# Altium footprint library OSHW_LuxonisMaster_20201223.PcbLib: 112 footprints (part 3 of 7)
Each footprint in its own frame and in the unit in brackets; x right, y up, seen from the top. Pads: shape width x height; smd on the part's side, far side on the other; paste and mask are expansions set on the pad; w line width, h text height; cw(c..) or ccw(c..) is an arc to the next point about the centre after c.
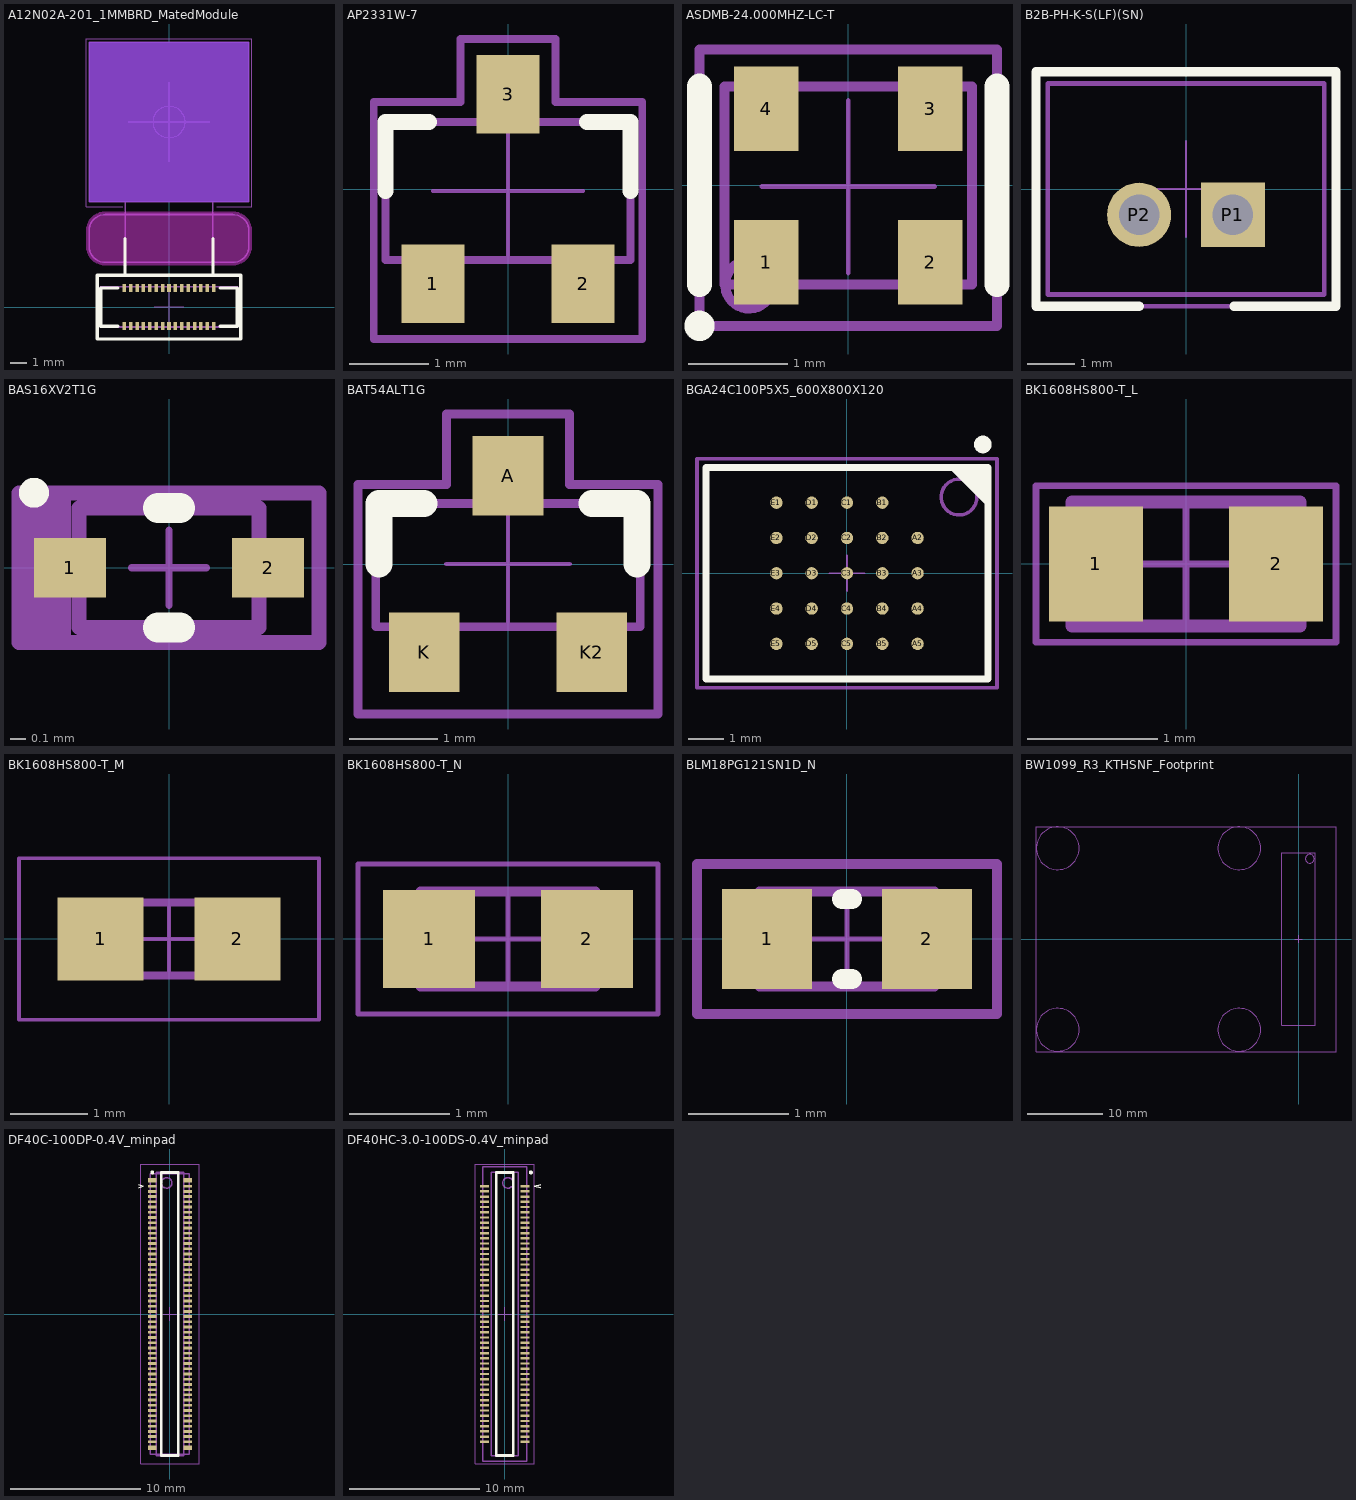
[diagram p2: the footprints below, top view; thin cyan lines are the x and y axes]

## A12N02A-201_1MMBRD_MatedModule [mm] "connector: 24-5804-030-000-829+ (1.4mm height w/ module mated)"
height 1.4
pads (30):
  rect 0.22x0.5 smd mask+0.05: 1(-2.8,-1.2) 2(-2.4,-1.2) 3(-2,-1.2) 4(-1.6,-1.2) 5(-1.2,-1.2) 6(-0.8,-1.2) 7(-0.4,-1.2) 8(0,-1.2) 9(0.4,-1.2) 10(0.8,-1.2) 11(1.2,-1.2) 12(1.6,-1.2) 13(2,-1.2) 14(2.4,-1.2) 15(2.8,-1.2) 16(2.8,1.2) 17(2.4,1.2) 18(2,1.2) 19(1.6,1.2) 20(1.2,1.2) 21(0.8,1.2) 22(0.4,1.2) 23(0,1.2) 24(-0.4,1.2) 25(-0.8,1.2) 26(-1.2,1.2) 27(-1.6,1.2) 28(-2,1.2) 29(-2.4,1.2) 30(-2.8,1.2)
Bottom Layer keep-out:
  region: -4.999,16.599 4.999,16.599 4.999,6.601 -4.999,6.601
Top Overlay:
  lines w0.2: -3.2,-1.2 -4.275,-1.2 -4.275,1.2 -3.2,1.2 ; -2.75,2 -2.75,4.3 ; 2.75,2 2.75,4.3 ; 3.2,-1.2 4.275,-1.2 4.275,1.2 3.2,1.2 ; -4.5,-2 4.5,-2 4.5,2 -4.5,2 -4.5,-2
Bottom Overlay:
  lines w0.2: -2.75,4.3 -2.75,6.6 ; 2.75,4.3 2.75,6.6 ; -5,6.6 5,6.6 5,16.6 -5,16.6 -5,6.6
Keep-Out Layer:
  board cut-out: -5,4.8 -5,4.898 -4.962,5.092 -4.886,5.274 -4.777,5.437 -4.637,5.577 -4.474,5.686 -4.292,5.762 -4.098,5.8 -4,5.8 4,5.8 4.098,5.8 4.292,5.762 4.474,5.686 4.637,5.577 4.777,5.437 4.886,5.274 4.962,5.092 5,4.898 5,4.8 5,3.8 5,3.702 4.962,3.508 4.886,3.326 4.777,3.163 4.637,3.023 4.474,2.914 4.292,2.838 4.098,2.8 4,2.8 -4,2.8 -4.098,2.8 -4.292,2.838 -4.474,2.914 -4.637,3.023 -4.777,3.163 -4.886,3.326 -4.962,3.508 -5,3.702 -5,3.8
Keep-Out Layer:
  lines w0.2: -5.1,3.8 ccw(c-4,3.8) -4,2.7 0,2.7 4,2.7 ccw(c4,3.8) 5.1,3.8 5.1,4.8 ccw(c4,4.8) 4,5.9 -4,5.9 ccw(c-4,4.8) -5.1,4.8 -5.1,3.8
Board:
  lines w0.1: -5,3.8 ccw(c-4,3.8) -4,2.8 4,2.8 ccw(c4,3.8) 5,3.8 5,4.8 ccw(c4,4.8) 4,5.8 -4,5.8 ccw(c-4,4.8) -5,4.8 -5,3.8
Top Assembly:
  lines w0.1: -2.75,4.3 -2.75,2 ; 2.75,4.3 2.75,2 ; -2.75,2 2.75,2 ; -2.75,2 -4.5,2 -4.5,-2 4.5,-2 4.5,2 2.75,2
  text "'.Designator'" at 0,0.006 h1
Bottom Assembly:
  circle w0.1: c0,11.6 r1
  lines w0.1: -2.75,4.3 -2.75,6.6 ; -2.51,11.6 2.51,11.6 ; 0,9.1 0,14.1 ; 2.75,4.3 2.75,6.6 ; 2.51,11.6 2.51,11.6 ; 4.999,16.6 4.999,6.601 -4.999,6.601 -4.999,16.599 5,16.599 5,16.6 ; 4.999,16.6 5,16.6
Top Courtyard:
  lines w0.05: -2.75,4.3 -2.75,2 ; -0.91,0.006 0,0.006 ; 0,-0.904 0,0.006 ; 0,0.916 0,0.006 ; 0.91,0.006 0,0.006 ; 2.75,4.3 2.75,2 ; -2.75,2 -4.5,2 -4.5,-2 4.5,-2 4.5,2 2.75,2 ; -2.75,2 2.75,2
Bottom Courtyard:
  lines w0.05: -2.91,6.3 -5.2,6.3 -5.2,16.8 5.2,16.8 5.2,15.6 5.2,6.3 3,6.3
Top Component Outline:
  lines w0.1: -4.3,-1.25 4.3,-1.25 4.3,1.262 -4.3,1.262 -4.3,-1.25
Bottom Component Outline:
  lines w0.1: -4.999,6.601 4.999,6.601 4.999,16.599 -4.999,16.599 -4.999,6.601
3D body: height 1.27, standoff 1.1, extent -2.75,2 2.75,4.3
3D body: height 1.4, standoff 1, extent -4.5,-2 4.5,2
3D body "K3D-WP7A-S030VA1-V2_JAE_Proprietary.STEP": height 0.65, standoff -0.03, extent -4.3,-1.25 4.3,1.262
3D body: height 0.55, standoff 0.35, extent -2.75,4.3 2.75,6.6
3D body: height 6.18, standoff 0.25, extent -4.999,6.601 4.999,16.599
3D body: height 3.29, standoff -3.29, extent -4.445,-2.032 -4.445,-2.032
3D body: height 3.29, standoff -3.29, extent -4.699,-4.191 -4.699,-4.191
3D body: height 3.29, standoff -3.29, extent -4.191,-5.715 -4.191,-5.715
3D body: height 3.29, standoff -3.29, extent -4.572,2.032 -4.572,2.032

## AP2331W-7 [mm]
pads (3):
  rect 0.8x1 smd: 1(-0.95,-1.2) 2(0.95,-1.2) 3(0,1.2)
Top Overlay:
  lines w0.2: -1.55,-0.025 -1.55,0.85 -1,0.85 ; 1,0.85 1.55,0.85 1.55,-0.025
Top Assembly:
  lines w0.1: -1.7,-1.9 -1.7,1.1 -0.6,1.1 -0.6,1.9 0.6,1.9 0.6,1.1 1.7,1.1 1.7,-1.9 -1.7,-1.9
  text "'.Designator'" at 0,-0.025 h1
Top Courtyard:
  lines w0.05: 0,-0.9 0,-0.025 ; 0,0.85 0,-0.025 ; 0.95,-0.025 0,-0.025 ; -0.95,-0.025 -0.95,-0.025 ; -0.95,-0.025 0,-0.025 ; 0,-0.025 0,-0.025 ; -1.7,-1.9 -1.7,1.1 -0.6,1.1 -0.6,1.9 0.6,1.9 0.6,1.1 1.7,1.1 1.7,-1.9 -1.7,-1.9
Top Component Outline:
  lines w0.1: -1.55,-0.9 -1.55,0.85 1.55,0.85 1.55,-0.9 -1.55,-0.9
3D body: height 1.4, standoff 0.1, extent -1.552,-0.9 1.552,0.85

## ASDMB-24.000MHZ-LC-T [mm]
pads (4):
  rect 0.65x0.85 smd: 1(-0.825,-0.775) 2(0.825,-0.775) 3(0.825,0.775) 4(-0.825,0.775)
Top Overlay:
  circle w0.254: c-1.5,-1.416 r0.025
  lines w0.254: -1.5,-1 -1.5,1 ; 1.5,-0.999 1.5,1
Top Assembly:
  circle w0.1: c-1,-1 r0.242
  lines w0.1: -1.5,-1.416 -1.5,1.37 1.5,1.37 1.5,-1.416 -1.5,-1.416
  text "'.Designator'" at 0,-0.011 h1
Top Courtyard:
  lines w0.05: -0.87,-0.011 0,-0.011 ; 0,-0.881 0,-0.011 ; 0,0.859 0,-0.011 ; 0.87,-0.011 0,-0.011 ; -1.5,-1.416 -1.5,1.37 1.5,1.37 1.5,-1.416 -1.5,-1.416
Top Component Outline:
  lines w0.1: -1.25,-1 1.25,-1 1.25,1 -1.25,1 -1.25,-1
3D body "ASDMB.STEP": height 0.86, standoff 0.01, extent -1.25,-1 1.25,1

## B2B-PH-K-S(LF)(SN) [mm] "3.4mm pins, 6mm housing"
height 6
pads (2):
  rect 1.368x1.368 hole 0.86: P1(1,-0.55)
  round 1.368 hole 0.86: P2(-1,-0.55)
Top Overlay:
  lines w0.2: -1,-2.5 -3.2,-2.5 -3.2,2.5 3.2,2.5 3.2,-2.5 1.024,-2.5
Top Assembly:
  lines w0.1: -3.2,-2.5 3.2,-2.5 3.2,2.5 -3.2,2.5 -3.2,-2.5
  text "'.Designator'" at 0,0 h1
Top Courtyard:
  lines w0.05: -1.024,0 0,0 ; 0,-1.024 0,0 ; 0,1.024 0,0 ; 1.024,0 0,0 ; -3.2,-2.5 -3.2,2.5 3.2,2.5 3.2,-2.5 -3.2,-2.5
Top Component Outline:
  lines w0.1: 2.95,-2.25 2.95,2.25 -2.95,2.25 -2.95,-2.25 2.95,-2.25 ; 2.95,-2.25 2.95,-2.25
3D body "B2B-PH-K-S(LF)(SN)--3DModel-STEP-56544.STEP": height 6, standoff -3.4, extent -2.95,-2.25 2.95,2.25

## BAS16XV2T1G [mm] "SOD, 2-Leads, Body 1.2x0.8mm"
height 0.7
pads (2):
  rect 0.48x0.4 smd: 1(-0.66,0) 2(0.66,0)
Top Overlay:
  circle w0.1: c-0.9,0.5 r0.05
  lines w0.2: -0.074,-0.4 0.074,-0.4 ; -0.074,0.4 0.074,0.4
Top Assembly:
  rectangle: -1,-0.5 -0.703,0.5
  lines w0.1: -0.703,-0.5 -0.703,0.5 ; -1,-0.5 1,-0.5 1,0.5 -1,0.5 -1,-0.5
  text "'.Designator'" at 0,0 h1
Top Courtyard:
  lines w0.05: -0.25,0 0.25,0 ; 0,-0.25 0,0.25 ; -1,-0.5 -1,0.5 1,0.5 1,-0.5 -1,-0.5
Top Component Outline:
  lines w0.1: -0.6,-0.4 -0.6,0.4 0.6,0.4 0.6,-0.4 -0.6,-0.4
3D body: height 0.7, standoff 0, extent -0.6,-0.4 0.6,0.4

## BAT54ALT1G [mm] "SOT-23 (TO-236)"
height 1.11
pads (3):
  rect 0.8x0.9 smd: A(0,1) K(-0.95,-1) K2(0.95,-1)
Top Overlay:
  lines w0.305: -1.46,0 -1.46,0.686 -0.952,0.686 ; 0.953,0.686 1.461,0.686 1.461,0
Top Assembly:
  lines w0.1: -1.7,-1.7 1.7,-1.7 1.7,0.9 0.698,0.9 0.698,1.7 -0.698,1.7 -0.698,0.9 -1.7,0.9 -1.7,-1.7
  text "'.Designator'" at 0,0 h1
Top Courtyard:
  lines w0.05: -0.698,0 0.002,0 ; -0.002,0 0.698,0 ; 0,-0.698 0,0.002 ; 0,0 0,0.7 ; -1.7,-1.7 1.7,-1.7 1.7,0.9 0.698,0.9 0.698,1.7 -0.698,1.7 -0.698,0.9 -1.7,0.9 -1.7,-1.7
Top Component Outline:
  lines w0.1: -1.499,-0.711 -1.499,0.686 1.499,0.686 1.499,-0.711 -1.499,-0.711
3D body: height 1.1, standoff 0, extent -1.5,-0.7 1.5,0.7
3D body: height 0.5, standoff 0, extent -0.15,0.7 0.15,1.1
3D body: height 0.5, standoff 0, extent 0.8,-1.1 1.1,-0.7
3D body: height 0.5, standoff 0, extent -1.1,-1.1 -0.8,-0.7

## BGA24C100P5X5_600X800X120 [mm] "BGA, 24-Leads, Body 6.00x8.00mmx1.20mm, Pitch 1.00mm"
height 1.2
pads (24):
  round 0.35 smd: A2(2,1) A3(2,0) A4(2,-1) A5(2,-2) B1(1,2) B2(1,1) B3(1,0) B4(1,-1) B5(1,-2) C1(0,2) C2(0,1) C3(0,0) C4(0,-1) C5(0,-2) D1(-1,2) D2(-1,1) D3(-1,0) D4(-1,-1) D5(-1,-2) E1(-2,2) E2(-2,1) E3(-2,0) E4(-2,-1) E5(-2,-2)
Top Overlay:
  circle w0.25: c3.85,3.65 r0.125
  region: 4,2 3,3 4,3
  lines w0.2: 3,3 4,2 ; -4,-3 4,-3 4,3 -4,3 -4,-3
Top Assembly:
  circle w0.1: c3.175,2.159 r0.508
  lines w0.1: -4.25,-3.25 4.25,-3.25 4.25,3.25 -4.25,3.25 -4.25,-3.25
  text "'.Designator'" at 0,0 h1
Top Courtyard:
  lines w0.05: -0.5,0 0.5,0 ; 0,-0.5 0,0.5 ; -4.25,-3.25 4.25,-3.25 4.25,3.25 -4.25,3.25 -4.25,-3.25
Top Component Outline:
  lines w0.1: -4,-3 4,-3 4,3 -4,3 -4,-3
3D body: height 1.2, standoff 0.2, extent -4,-3 4,3

## BK1608HS800-T_L [mm] "Chip Inductor, 2-Leads, Body 1.60x0.80mm, IPC High Density"
height 0.95
pads (2):
  rect 0.72x0.88 smd: 1(-0.69,0) 2(0.69,0)
Top Assembly:
  lines w0.1: -0.875,-0.475 -0.875,0.475 0.875,0.475 0.875,-0.475 -0.875,-0.475
  text "'.Designator'" at 0,0 h1
Top Courtyard:
  lines w0.05: -0.475,0 0.475,0 ; 0,-0.475 0,0.475 ; -1.15,-0.6 -1.15,0.6 1.15,0.6 1.15,-0.6 -1.15,-0.6
3D body: height 0.95, standoff 0, extent -0.575,-0.475 0.575,0.475
3D body: height 0.95, standoff 0, extent -0.875,-0.475 -0.575,0.475
3D body: height 0.95, standoff 0, extent 0.575,-0.475 0.875,0.475

## BK1608HS800-T_M [mm] "Chip Inductor, 2-Leads, Body 1.60x0.80mm, IPC Low Density"
height 0.95
pads (2):
  rect 1.12x1.08 smd: 1(-0.89,0) 2(0.89,0)
Top Assembly:
  lines w0.1: -0.875,-0.475 -0.875,0.475 0.875,0.475 0.875,-0.475 -0.875,-0.475
  text "'.Designator'" at 0,0 h1
Top Courtyard:
  lines w0.05: -0.475,0 0.475,0 ; 0,-0.475 0,0.475 ; -1.95,-1.05 -1.95,1.05 1.95,1.05 1.95,-1.05 -1.95,-1.05
3D body: height 0.95, standoff 0, extent -0.575,-0.475 0.575,0.475
3D body: height 0.95, standoff 0, extent -0.875,-0.475 -0.575,0.475
3D body: height 0.95, standoff 0, extent 0.575,-0.475 0.875,0.475

## BK1608HS800-T_N [mm] "Chip Inductor, 2-Leads, Body 1.60x0.80mm, IPC Medium Density"
height 0.95
pads (2):
  rect 0.92x0.98 smd: 1(-0.79,0) 2(0.79,0)
Top Assembly:
  lines w0.1: -0.875,-0.475 -0.875,0.475 0.875,0.475 0.875,-0.475 -0.875,-0.475
  text "'.Designator'" at 0,0 h1
Top Courtyard:
  lines w0.05: -0.475,0 0.475,0 ; 0,-0.475 0,0.475 ; -1.5,-0.75 -1.5,0.75 1.5,0.75 1.5,-0.75 -1.5,-0.75
3D body: height 0.95, standoff 0, extent -0.575,-0.475 0.575,0.475
3D body: height 0.95, standoff 0, extent -0.875,-0.475 -0.575,0.475
3D body: height 0.95, standoff 0, extent 0.575,-0.475 0.875,0.475

## BLM18PG121SN1D_N [mm] "Chip Inductor, 2-Leads, Body 1.60x0.80mm, IPC Medium Density"
height 0.95
pads (2):
  rect 0.9x1 smd: 1(-0.8,0) 2(0.8,0)
Top Overlay:
  lines w0.2: -0.05,-0.4 0.05,-0.4 ; -0.05,0.4 0.05,0.4
Top Assembly:
  lines w0.1: -1.5,-0.75 -1.5,0.75 1.5,0.75 1.5,-0.75 -1.5,-0.75
  text "'.Designator'" at 0,0 h1
Top Courtyard:
  lines w0.05: -0.475,0 0.475,0 ; 0,-0.475 0,0.475 ; -1.5,-0.75 -1.5,0.75 1.5,0.75 1.5,-0.75 -1.5,-0.75
Top Component Outline:
  lines w0.1: -0.875,-0.475 -0.875,0.475 0.875,0.475 0.875,-0.475 -0.875,-0.475
3D body: height 1, standoff 0, extent 0.525,-0.475 0.875,0.475
3D body: height 1, standoff 0, extent -0.875,-0.475 -0.525,0.475
3D body: height 1, standoff 0, extent -0.525,-0.475 0.525,0.475

## BW1099_R3_KTHSNF_Footprint [mm] "Graphical/Mechanical footprint for BW1099"
Top Assembly:
  circle w0.1: c-7.9,-12.1 r2.85
  circle w0.1: c-7.9,12.1 r2.85
  circle w0.1: c-32.1,-12.1 r2.85
  circle w0.1: c-32.1,12.1 r2.85
  circle w0.1: c1.5,10.7 r0.583
  lines w0.1: -0.5,0 0.5,0 ; 0,-0.5 0,0.5 ; -35,-15 -35,15 5,15 5,-15 -35,-15 ; -2.25,-11.5 -2.25,11.5 2.25,11.5 2.25,-11.5 -2.25,-11.5
  text "BW1099 Module" at -23.75,-0.8 h2
Top Courtyard:
  circle w0.1: c-32.1,-12.1 r2.85
  circle w0.1: c-7.9,-12.1 r2.85
  circle w0.1: c-7.9,12.1 r2.85
  circle w0.1: c-32.1,12.1 r2.85
  lines w0.05: -0.5,0 0.5,0 ; 0,-0.5 0,0.5 ; -35,-15 5,-15 5,15 -35,15 -35,-15 ; -2.25,-11.5 2.25,-11.5 2.25,11.5 -2.25,11.5 -2.25,-11.5
3D body "BW1099_R3M2E3_KTHSNF.step": height 15, standoff -2.82, extent -35,-15 5,15

## CI_HEAT_SINK_BW1099 [mm] "Cool Innovations heatsink for BW1099"
height 10.2
3D body "Heatsink_3-151204US76698.x_t": height 10.16, standoff 0, extent -40,0 0,30

## CI_notch_Heat_Sink_BW1099 [mm] "Cool Innovations \"Notch\" heatsink for BW1099 w/ vertical JTAG connector"
height 10.2
3D body "Notch_heatsink_3-151204US76736.x_t": height 10.16, standoff 0, extent -40,0 0,30

## DF40C-100DP-0.4V_minpad [mm] "CONN HDR 100POS 0.4MM SMD GOLD"
height 1.29
pads (104):
  rect 0.66x0.21 smd: 1(-1.355,9.8) 2(1.355,9.8) 3(-1.355,9.4) 4(1.355,9.4) 5(-1.355,9) 6(1.355,9) 7(-1.355,8.6) 8(1.355,8.6) 9(-1.355,8.2) 10(1.355,8.2) 11(-1.355,7.8) 12(1.355,7.8) 13(-1.355,7.4) 14(1.355,7.4) 15(-1.355,7) 16(1.355,7) 17(-1.355,6.6) 18(1.355,6.6) 19(-1.355,6.2) 20(1.355,6.2) 21(-1.355,5.8) 22(1.355,5.8) 23(-1.355,5.4) 24(1.355,5.4) 25(-1.355,5) 26(1.355,5) 27(-1.355,4.6) 28(1.355,4.6) 29(-1.355,4.2) 30(1.355,4.2) 31(-1.355,3.8) 32(1.355,3.8) 33(-1.355,3.4) 34(1.355,3.4) 35(-1.355,3) 36(1.355,3) 37(-1.355,2.6) 38(1.355,2.6) 39(-1.355,2.2) 40(1.355,2.2) 41(-1.355,1.8) 42(1.355,1.8) 43(-1.355,1.4) 44(1.355,1.4) 45(-1.355,1) 46(1.355,1) 47(-1.355,0.6) 48(1.355,0.6) 49(-1.355,0.2) 50(1.355,0.2) 51(-1.355,-0.2) 52(1.355,-0.2) 53(-1.355,-0.6) 54(1.355,-0.6) 55(-1.355,-1) 56(1.355,-1) 57(-1.355,-1.4) 58(1.355,-1.4) 59(-1.355,-1.8) 60(1.355,-1.8) 61(-1.355,-2.2) 62(1.355,-2.2) 63(-1.355,-2.6) 64(1.355,-2.6) 65(-1.355,-3) 66(1.355,-3) 67(-1.355,-3.4) 68(1.355,-3.4) 69(-1.355,-3.8) 70(1.355,-3.8) 71(-1.355,-4.2) 72(1.355,-4.2) 73(-1.355,-4.6) 74(1.355,-4.6) 75(-1.355,-5) 76(1.355,-5) 77(-1.355,-5.4) 78(1.355,-5.4) 79(-1.355,-5.8) 80(1.355,-5.8) 81(-1.355,-6.2) 82(1.355,-6.2) 83(-1.355,-6.6) 84(1.355,-6.6) 85(-1.355,-7) 86(1.355,-7) 87(-1.355,-7.4) 88(1.355,-7.4) 89(-1.355,-7.8) 90(1.355,-7.8) 91(-1.355,-8.2) 92(1.355,-8.2) 93(-1.355,-8.6) 94(1.355,-8.6) 95(-1.355,-9) 96(1.355,-9) 97(-1.355,-9.4) 98(1.355,-9.4) 99(-1.355,-9.8) 100(1.355,-9.8)
  rect 0.66x0.33 smd: S1(-1.355,10.265) S2(1.355,10.265) S3(-1.355,-10.265) S4(1.355,-10.265)
Top Overlay:
  circle w0.254: c-1.355,10.85 r0.025
  lines w0.102: -2.392,9.685 -2.05,9.8 -2.392,9.915
  lines w0.2: -0.65,-10.85 0.65,-10.85 0.65,10.85 -0.65,10.85 -0.65,-10.85
Top Assembly:
  circle w0.1: c-0.25,10.05 r0.4
  lines w0.1: -1.05,-10.85 1.05,-10.85 1.05,10.85 -1.05,10.85 -1.05,-10.85
  text "'.Designator'" at 0,0 h1
Top Courtyard:
  lines w0.05: -0.5,0 0.5,0 ; 0,-0.5 0,0.5 ; -2.25,-11.5 -2.25,11.5 2.25,11.5 2.25,-11.5 -2.25,-11.5
Top Component Outline:
  lines w0.1: -1.49,-10.76 -1.49,10.76 1.48,10.76 1.48,-10.76 -1.49,-10.76
3D body: height 17.52, standoff -4, extent 0,0 0,0
3D body "DF40C-100DP.stp": height 1.12, standoff -0.02, extent -1.49,-10.76 1.48,10.76

## DF40HC-3.0-100DS-0.4V_minpad [mm] "3.0MM MATED HEIGHT CONN HDR 100POS 0.4MM SMD GOLD"
height 2.9
pads (100):
  rect 0.7x0.18 smd: 1(1.54,9.8) 2(-1.54,9.8) 3(1.54,9.4) 4(-1.54,9.4) 5(1.54,9) 6(-1.54,9) 7(1.54,8.6) 8(-1.54,8.6) 9(1.54,8.2) 10(-1.54,8.2) 11(1.54,7.8) 12(-1.54,7.8) 13(1.54,7.4) 14(-1.54,7.4) 15(1.54,7) 16(-1.54,7) 17(1.54,6.6) 18(-1.54,6.6) 19(1.54,6.2) 20(-1.54,6.2) 21(1.54,5.8) 22(-1.54,5.8) 23(1.54,5.4) 24(-1.54,5.4) 25(1.54,5) 26(-1.54,5) 27(1.54,4.6) 28(-1.54,4.6) 29(1.54,4.2) 30(-1.54,4.2) 31(1.54,3.8) 32(-1.54,3.8) 33(1.54,3.4) 34(-1.54,3.4) 35(1.54,3) 36(-1.54,3) 37(1.54,2.6) 38(-1.54,2.6) 39(1.54,2.2) 40(-1.54,2.2) 41(1.54,1.8) 42(-1.54,1.8) 43(1.54,1.4) 44(-1.54,1.4) 45(1.54,1) 46(-1.54,1) 47(1.54,0.6) 48(-1.54,0.6) 49(1.54,0.2) 50(-1.54,0.2) 51(1.54,-0.2) 52(-1.54,-0.2) 53(1.54,-0.6) 54(-1.54,-0.6) 55(1.54,-1) 56(-1.54,-1) 57(1.54,-1.4) 58(-1.54,-1.4) 59(1.54,-1.8) 60(-1.54,-1.8) 61(1.54,-2.2) 62(-1.54,-2.2) 63(1.54,-2.6) 64(-1.54,-2.6) 65(1.54,-3) 66(-1.54,-3) 67(1.54,-3.4) 68(-1.54,-3.4) 69(1.54,-3.8) 70(-1.54,-3.8) 71(1.54,-4.2) 72(-1.54,-4.2) 73(1.54,-4.6) 74(-1.54,-4.6) 75(1.54,-5) 76(-1.54,-5) 77(1.54,-5.4) 78(-1.54,-5.4) 79(1.54,-5.8) 80(-1.54,-5.8) 81(1.54,-6.2) 82(-1.54,-6.2) 83(1.54,-6.6) 84(-1.54,-6.6) 85(1.54,-7) 86(-1.54,-7) 87(1.54,-7.4) 88(-1.54,-7.4) 89(1.54,-7.8) 90(-1.54,-7.8) 91(1.54,-8.2) 92(-1.54,-8.2) 93(1.54,-8.6) 94(-1.54,-8.6) 95(1.54,-9) 96(-1.54,-9) 97(1.54,-9.4) 98(-1.54,-9.4) 99(1.54,-9.8) 100(-1.54,-9.8)
Top Overlay:
  circle w0.254: c2,10.85 r0.025
  lines w0.102: 2.75,9.685 2.25,9.8 2.75,9.915
  lines w0.2: -0.65,-10.85 0.65,-10.85 0.65,10.85 -0.65,10.85 -0.65,-10.85
Top Assembly:
  circle w0.1: c0.25,10.05 r0.4
  lines w0.1: -1.05,-10.85 1.05,-10.85 1.05,10.85 -1.05,10.85 -1.05,-10.85
  text "'.Designator'" at 0,0 h1
Top Courtyard:
  lines w0.05: -0.5,0 0.5,0 ; 0,-0.5 0,0.5 ; -2.25,-11.5 -2.25,11.5 2.25,11.5 2.25,-11.5 -2.25,-11.5
Top Component Outline:
  lines w0.1: -1.69,-11.305 -1.69,11.295 1.69,11.295 1.69,-11.305 -1.69,-11.305
3D body: height 17.52, standoff -4, extent 0,0 0,0
3D body "DF40HC(3.0)-100DS-0.4V.stp": height 2.85, standoff -0.05, extent -1.69,-11.305 1.69,11.295